# Altium footprint library LibreriasUniversalesMatuTorres.PcbLib: 48 footprints (part 2 of 3)
Each footprint in its own frame and in the unit in brackets; x right, y up, seen from the top. Pads: shape width x height; smd on the part's side, far side on the other; paste and mask are expansions set on the pad; w line width, h text height; cw(c..) or ccw(c..) is an arc to the next point about the centre after c.
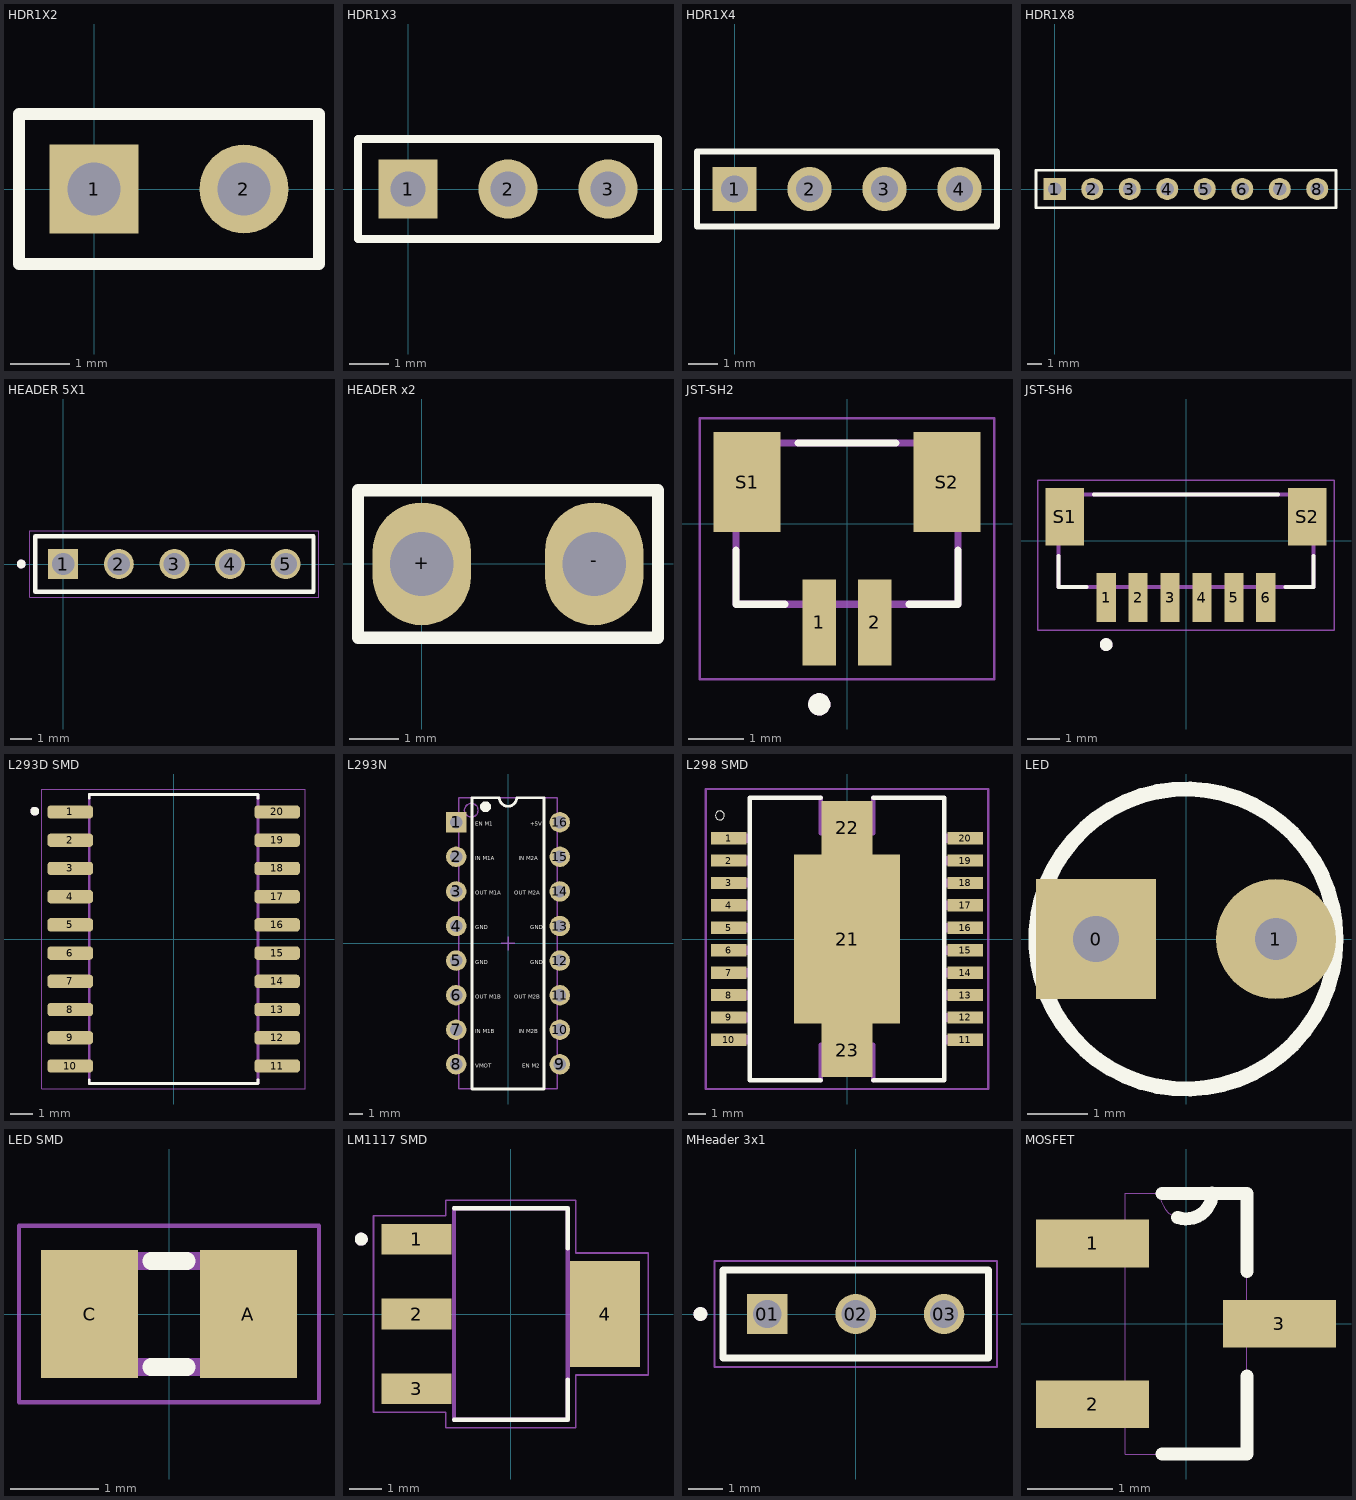
[diagram p1: the footprints below, top view; thin cyan lines are the x and y axes]

## HDR1X2 [mm] "Connector; Header; 2 Position"
pads (2):
  rect 1.5x1.5 hole 0.9: 1(0,0)
  round 1.5 hole 0.9: 2(2.54,0)
Top Overlay:
  lines w0.2: -1.27,-1.27 -1.27,1.27 3.81,1.27 3.81,-1.27 -1.27,-1.27
3D body "54101G0802LF.STEP": height 8.18, standoff -3.25, extent -1.28,-1.233 3.8,1.18

## HDR1X3 [mm] "Connector; Header; 3 Position"
pads (3):
  rect 1.5x1.5 hole 0.9: 1(0,0)
  round 1.5 hole 0.9: 2(2.54,0) 3(5.08,0)
Top Overlay:
  lines w0.2: -1.27,-1.27 6.35,-1.27 6.35,1.27 -1.27,1.27 -1.27,-1.27
3D body "DS1021-1_3SF1-1.STEP": height 8.6, standoff -3, extent -1.27,-1.27 6.35,1.27

## HDR1X4 [mm] "Connector; Header; 4 Position"
pads (4):
  rect 1.5x1.5 hole 0.9: 1(0,0)
  round 1.5 hole 0.9: 2(2.54,0) 3(5.08,0) 4(7.62,0)
Top Overlay:
  lines w0.2: -1.27,-1.27 -1.27,1.27 8.89,1.27 8.89,-1.27 -1.27,-1.27
3D body "TSW-104-24-G-S.stp": height 9.27, standoff -2.92, extent -1.422,-1.27 8.865,1.27

## HDR1X8 [mm] "Connector; Header; 8 Position"
pads (8):
  rect 1.5x1.5 hole 0.9: 1(0,0)
  round 1.5 hole 0.9: 2(2.54,0) 3(5.08,0) 4(7.62,0) 5(10.16,0) 6(12.7,0) 7(15.24,0) 8(17.78,0)
Top Overlay:
  lines w0.2: -1.27,-1.27 19.05,-1.27 19.05,1.27 -1.27,1.27 -1.27,-1.27

## HEADER 5X1 [mm]
pads (5):
  rect 1.37x1.37 hole 1.02: 1(0,0)
  round 1.37 hole 1.02: 2(2.54,0) 3(5.08,0) 4(7.62,0) 5(10.16,0)
Top Overlay:
  circle w0.2: c-1.92,0 r0.1
  lines w0.2: -1.27,-1.27 -1.27,1.27 11.43,1.27 11.43,-1.27 -1.27,-1.27
Mechanical 13:
  circle w0.2: c-1.92,0 r0.1
  lines w0.1: -1.27,-1.27 -1.27,1.27 11.43,1.27 11.43,-1.27 -1.27,-1.27
Mechanical 15:
  lines w0.05: -1.52,-1.52 -1.52,1.52 11.68,1.52 11.68,-1.52 -1.52,-1.52
3D body "TSW-105-23-L-S.stp": height 8.38, standoff -2.92, extent -1.333,-1.27 11.493,1.27

## HEADER x2 [mm]
pads (2):
  oval 2x2.5 hole 1.3: +(0,0) -(3.508,0)
Top Overlay:
  lines w0.254: -1.298,-1.501 -1.298,1.496 4.806,1.496 4.806,-1.501 -1.298,-1.501
3D body "54102-T0801LF--3DModel-STEP-554624.STEP": height 8.38, standoff -3.05, extent -0.662,-1.524 4.168,1.016

## JST-SH2 [mm]
height 6.3
pads (4):
  rect 0.6x1.55 smd: 1(-0.5,-1.775) 2(0.5,-1.775)
  rect 1.2x1.8 smd: S1(-1.8,0.75) S2(1.8,0.75)
Top Overlay:
  circle w0.2: c-0.5,-3.25 r0.1
  lines w0.127: -2,-0.47 -2,-1.45 -1.12,-1.45 ; -0.88,1.45 0.88,1.45 ; 1.12,-1.45 2,-1.45 2,-0.47
Mechanical 13:
  circle w0.2: c-0.5,-3.25 r0.1
  lines w0.127: -2,-1.45 2,-1.45 2,1.45 -2,1.45 -2,-1.45
Mechanical 15:
  lines w0.05: -2.65,-2.8 -2.65,1.9 2.65,1.9 2.65,-2.8 -2.65,-2.8
3D body "step_temp.STEP": height 4.25, standoff 0, extent -2,-2.9 2,0.7

## JST-SH6 [mm]
height 6.3
pads (8):
  rect 0.6x1.55 smd: 1(-2.5,-1.775) 2(-1.5,-1.775) 3(-0.5,-1.775) 4(0.5,-1.775) 5(1.5,-1.775) 6(2.5,-1.775)
  rect 1.2x1.8 smd: S1(-3.8,0.75) S2(3.8,0.75)
Top Overlay:
  circle w0.2: c-2.5,-3.25 r0.1
  lines w0.127: -4,-0.47 -4,-1.45 -3.12,-1.45 ; -2.88,1.45 2.88,1.45 ; 3.12,-1.45 4,-1.45 4,-0.47
Mechanical 13:
  circle w0.2: c-2.5,-3.25 r0.1
  lines w0.127: -4,-1.45 -4,1.45 4,1.45 4,-1.45 -4,-1.45
Mechanical 15:
  lines w0.05: -4.65,-2.8 4.65,-2.8 4.65,1.9 -4.65,1.9 -4.65,-2.8
3D body "step_temp.STEP": height 4.25, standoff 0, extent -3.873,-2.138 4.127,1.462

## L293D SMD [mm]
pads (20):
  rrect50% 2.05x0.6 smd: 1(-4.655,5.715) 2(-4.655,4.445) 3(-4.655,3.175) 4(-4.655,1.905) 5(-4.655,0.635) 6(-4.655,-0.635) 7(-4.655,-1.905) 8(-4.655,-3.175) 9(-4.655,-4.445) 10(-4.655,-5.715) 11(4.655,-5.715) 12(4.655,-4.445) 13(4.655,-3.175) 14(4.655,-1.905) 15(4.655,-0.635) 16(4.655,0.635) 17(4.655,1.905) 18(4.655,3.175) 19(4.655,4.445) 20(4.655,5.715)
Top Overlay:
  circle w0.2: c-6.25,5.75 r0.1
  lines w0.127: -3.8,-6.33 -3.8,-6.5 3.8,-6.5 3.8,-6.33 ; -3.8,6.33 -3.8,6.5 3.8,6.5 3.8,6.33
Mechanical 13:
  circle w0.2: c-6.25,5.75 r0.1
  lines w0.127: -3.8,-6.5 -3.8,6.5 3.8,6.5 3.8,-6.5 -3.8,-6.5
Mechanical 15:
  lines w0.05: -5.93,-6.75 -5.93,6.75 5.93,6.75 5.93,-6.75 -5.93,-6.75
3D body "L293DD--3DModel-STEP-56544.STEP": height 2.65, standoff 0, extent -5.137,-6.502 5.188,6.298

## L293N [mm] "DIP, 16-Leads, Row Spacing 7.62mm, Pitch 2.54mm, Body 20.07x6.73mm"
height 5.08
pads (16):
  rect 1.5x1.5 hole 0.9: 1(-3.81,8.89)
  round 1.5 hole 0.9: 2(-3.81,6.35) 3(-3.81,3.81) 4(-3.81,1.27) 5(-3.81,-1.27) 6(-3.81,-3.81) 7(-3.81,-6.35) 8(-3.81,-8.89) 9(3.81,-8.89) 10(3.81,-6.35) 11(3.81,-3.81) 12(3.81,-1.27) 13(3.81,1.27) 14(3.81,3.81) 15(3.81,6.35) 16(3.81,8.89)
Top Overlay:
  circle w0.6: c-1.651,10.033 r0.1
  lines w0.2: -2.65,-10.7 2.65,-10.7 2.65,10.7 0.635,10.7 cw(c0,10.7) -0.635,10.7 -2.65,10.7 -2.65,-10.7
  text "EN M1" at -2.413,8.636 h0.3
  text "IN M1A" at -2.413,6.096 h0.3
  text "OUT M1A" at -2.413,3.556 h0.3
  text "GND" at -2.413,1.016 h0.3
  text "IN M1B" at -2.413,-6.604 h0.3
  text "VMOT" at -2.413,-9.144 h0.3
  text "OUT M2A" at 0.451,3.556 h0.3
  text "GND" at 1.651,1.016 h0.3
  text "EN M2" at 1.051,-9.144 h0.3
  text "+5V" at 1.651,8.636 h0.3
  text "IN M2A" at 0.801,6.096 h0.3
  text "GND" at -2.413,-1.524 h0.3
  text "GND" at 1.651,-1.524 h0.3
  text "OUT M1B" at -2.413,-4.064 h0.3
  text "IN M2B" at 0.801,-6.604 h0.3
  text "OUT M2B" at 0.451,-4.064 h0.3
Mechanical 13:
  circle w0.1: c-2.7,9.775 r0.5
  lines w0.1: -3.6,-10.675 3.6,-10.675 3.6,10.675 -3.6,10.675 -3.6,-10.675
Mechanical 15:
  lines w0.1: -0.5,0 0.5,0 ; 0,-0.5 0,0.5
3D body "74HC595N,112.STEP": height 4.2, standoff -3.32, extent -4.699,-9.513 4.744,9.513

## L298 SMD [mm]
pads (23):
  rect 2x0.7 smd: 1(-6.7,5.715) 2(-6.7,4.445) 3(-6.7,3.175) 4(-6.7,1.905) 5(-6.7,0.635) 6(-6.7,-0.635) 7(-6.7,-1.905) 8(-6.7,-3.175) 9(-6.7,-4.445) 10(-6.7,-5.715) 11(6.7,-5.715) 12(6.7,-4.445) 13(6.7,-3.175) 14(6.7,-1.905) 15(6.7,-0.635) 16(6.7,0.635) 17(6.7,1.905) 18(6.706,3.175) 19(6.7,4.445) 20(6.7,5.715)
  rect 6x9.6 smd paste-6: 21(0,0)
  rect 2.9x3.05 smd paste-3: 22(0,6.3) 23(0,-6.3)
Top Overlay:
  circle w0: c-7.2,7 r0.254
  lines w0.254: -1.5,-8 -5.5,-8 -5.5,8 -1.5,8 ; 1.5,-8 5.5,-8 5.5,8 1.5,8
Mechanical 13:
  circle w0.127: c0,-5 r0.671
  circle w0.127: c0,5 r0.671
  region: -5.465,4.19 -7.037,4.19 -7.037,4.703 -5.465,4.703
  region: -5.464,2.92 -7.037,2.92 -7.037,3.432 -5.464,3.432
  region: 7.087,5.466 5.517,5.466 5.517,5.969 7.087,5.969
  region: 7.087,4.192 5.513,4.192 5.513,4.699 7.087,4.699
  region: 7.087,2.923 5.514,2.923 5.514,3.428 7.087,3.428
  region: 7.088,1.653 5.514,1.653 5.514,2.157 7.088,2.157
  region: 7.088,0.382 5.513,0.382 5.513,0.888 7.088,0.888
  region: 7.091,-0.886 5.515,-0.886 5.515,-0.386 7.091,-0.386
  region: 7.091,-2.157 5.513,-2.157 5.513,-1.655 7.091,-1.655
  region: 7.089,-3.429 5.512,-3.429 5.512,-2.923 7.089,-2.923
  region: 7.097,-4.698 5.513,-4.698 5.513,-4.201 7.097,-4.201
  region: 7.091,-5.969 5.512,-5.969 5.512,-5.466 7.091,-5.466
  region: -5.461,-5.977 -7.044,-5.977 -7.044,-5.461 -5.461,-5.461
  region: -5.462,-4.708 -7.045,-4.708 -7.045,-4.19 -5.462,-4.19
  region: -5.462,-3.431 -7.038,-3.431 -7.038,-2.92 -5.462,-2.92
  region: -5.464,-2.167 -7.043,-2.167 -7.043,-1.648 -5.464,-1.648
  region: -5.465,-0.896 -7.043,-0.896 -7.043,-0.377 -5.465,-0.377
  region: -5.467,0.375 -7.042,0.375 -7.042,0.895 -5.467,0.895
  region: -5.469,1.646 -7.041,1.646 -7.041,2.167 -5.469,2.167
  region: -5.466,5.46 -7.036,5.46 -7.036,5.974 -5.466,5.974
  lines w0.254: -1.5,-8 -1.5,-6 1.5,-6 1.5,-8 ; -1.5,8 -1.5,6 1.5,6 1.5,8
Mechanical 15:
  lines w0.127: -8,-8.5 8,-8.5 8,8.5 -8,8.5 -8,-8.5
3D body "step_temp.STEP": height 3.6, standoff 0, extent -7.061,-7.925 7.139,7.975

## LED [mm]
pads (2):
  rect 2x2 hole 0.762: 0(-1.5,0)
  round 2 hole 0.7: 1(1.5,0)
Top Overlay:
  circle w0.254: c0,0 r2.5
3D body "WP7113LSRD.STEP": height 9.6, standoff -26, extent -2.979,-2.921 2.471,2.979

## LED SMD [mm] "0805"
pads (2):
  rect 1.1x1.45 smd: A(0.9,0) C(-0.9,0)
Top Overlay:
  lines w0.2: -0.2,-0.6 0.2,-0.6 ; -0.2,0.6 0.2,0.6
Mechanical 13:
  region: 1,-0.6 0.5,-0.6 0.5,0.6 1,0.6
  region: -0.5,-0.6 -1,-0.6 -1,0.6 -0.5,0.6
  lines w0.2: -1,-0.6 -1,0.6 1,0.6 1,-0.6 -1,-0.6
Mechanical 15:
  lines w0.05: -1.7,-1 -1.7,1 1.7,1 1.7,-1 -1.7,-1
3D body "597-5311-402F.STEP": height 0.7, standoff 0, extent -0.949,-0.65 1.051,0.6

## LM1117 SMD [mm]
height 1.8
pads (4):
  rect 2.15x0.95 smd: 1(-2.9,2.3) 2(-2.9,0) 3(-2.9,-2.3)
  rect 2.15x3.25 smd: 4(2.9,0)
Top Overlay:
  circle w0.2: c-4.6,2.3 r0.1
  lines w0.127: -1.75,-3.25 1.75,-3.25 1.75,-2.01 ; -1.75,3.25 1.75,3.25 1.75,2.01
Mechanical 13:
  circle w0.2: c-4.6,2.3 r0.1
  lines w0.127: -1.75,-3.25 1.75,-3.25 1.75,3.25 -1.75,3.25 -1.75,-3.25
Mechanical 15:
  lines w0.05: -4.225,-3.025 -2,-3.025 -2,-3.5 2,-3.5 2,-1.875 4.225,-1.875 4.225,1.875 2,1.875 2,3.5 -2,3.5 -2,3.025 -4.225,3.025 -4.225,-3.025
3D body "LM1117MPX-3.3.STEP": height 1.8, standoff 0, extent -3.651,-3.301 3.347,3.199

## MHeader 3x1 [mil]
pads (3):
  rect 45.78x45.78 / inner round 45.78 / far side rect 45.78x45.78 hole 32: 01(-100,0)
  round 45.78 hole 32: 02(0,0) 03(100,0)
Top Overlay:
  circle w7.87: c-175.59,0 r3.94
  lines w7.87: -150,-50 150,-50 150,50 -150,50 -150,-50
Mechanical 13:
  circle w7.87: c-175.59,0 r3.94
  lines w3.94: -150,-50 -150,50 ; -150,-50 150,-50 ; -150,-50 -150,50 ; -150,50 150,50 ; -150,50 150,50 ; 150,-50 150,50 ; 150,-50 150,50
Mechanical 15:
  lines w1.97: -159.84,-59.84 159.84,-59.84 159.84,59.84 -159.84,59.84 -159.84,-59.84
3D body "DS1021-1_3SF1-1.STEP": height 338.58, standoff -118.11, extent -150,-50 150,50

## MOSFET [mil]
pads (3):
  rect 52x22 smd: 1(-43,37) 2(-43,-37) 3(43,0)
Top Overlay:
  lines w6: -11,-60 28,-60 28,-24 ; -11,60 12,60 28,60 28,24 ; -3.9,48.96 ccw(c0.15,60.1) 12,60.1
Mechanical 13:
  lines w0: -28,-47 -28,-60 28,-60 28,-10 ; -28,-47 -28,-28 ; -28,-47 -52,-47 -52,-28 -28,-28 ; -28,-28 -28,28 ; -28,28 -28,47 ; -28,28 -52,28 -52,47 -28,47 ; -28,47 -28,60 -12,60 ; -12,60 ccw(c0,60) 12,60 ; -12,60 12,60 ; 12,60 28,60 28,10 ; 28,-10 28,10 ; 28,-10 52,-10 52,10 28,10
3D body "step_temp.STEP": height 44.09, standoff 0, extent -49.41,-57.48 49.41,57.48